# Altium schematic symbol library Transistor.SchLib: 3457 symbols (part 24 of 27)
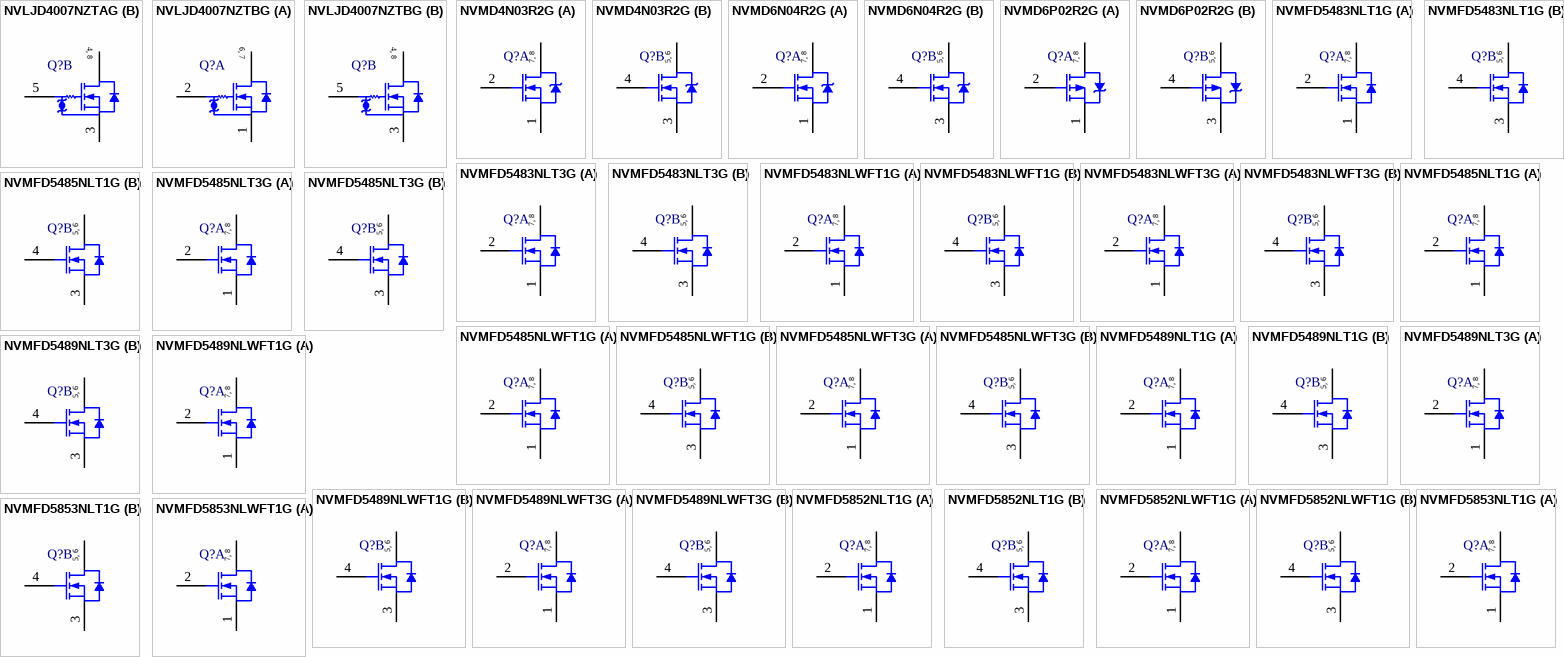
[diagram p117: symbols NVLJD4007NZTAG to NVMFD5853NLWFT1G]

## NVMFD5483NLT1G
designator Q?
Power MOSFET, 60 V, 36 mOhm , 24 A, Dual N-Channel, 8-Pin DFN, Pb-Free, Tape and Reel; Manufacturer: On Semiconductor; PartNumber: NVMFD5483NLT1G; Channel Polarity: N Channel; Ciss Typ (pF): 668; Coss Typ (pF): 152; Crss Typ (pF): 67; ID Max (A): 24; Qrr Typ (nC): 35; V(BR)DSS Min (V): 60; VGS Max (V): 20; VGS(th) Max (V): 2.5; DatasheetVersion: Rev. 1; PackageVersion: Rev. E, 02/2013; PackageReference: DFN-8-506BT; PackageDescription: 8-Pin Small Outline No-Lead, Body 4.9 x 5.9 mm, Pitch 1.27 mm; Supplier 1: Newark; Supplier Part Number 1: 11X3703; Supplier 2: Mouser; Supplier Part Number 2: 863-NVMFD5483NLT1G; Configuration: Dual; Package Type: DFN-8; Packing: Tape and Reel; RoHS: Pb-Free; Mounting Technology: Surface Mount; ComponentLink1Description: Manufacturer URL; ComponentLink1URL: http://www.onsemi.com/; ComponentLink2Description: Datasheet; ComponentLink2URL: http://www.onsemi.com/pub_link/Collateral/NVMFD5483NL-D.PDF; ComponentLink3Description: Package Specification; ComponentLink3URL: http://www.onsemi.com/pub_link/Collateral/506BT.PDF
footprint ONSC-DFN-8-506BT_V (DFN, 8-Leads, Body 5.9x4.9mm, Pitch 1.27mm)
part A pins: 1 S1, 2 G1, 7 D1, 8 D1
part B pins: 3 S2, 4 G2, 5 D2, 6 D2
part A text: 7, 8
part B text: 5, 6

## NVMFD5483NLT3G
designator Q?
Power MOSFET, 60 V, 24 A, 36 mOhm, Dual N-Channel, 8-Pin DFN, Pb-Free, Tape and Reel; Manufacturer: On Semiconductor; PartNumber: NVMFD5483NLT3G; Channel Polarity: N Channel; Ciss Typ (pF): 668; Coss Typ (pF): 152; Crss Typ (pF): 67; ID Max (A): 24; Qrr Typ (nC): 35; V(BR)DSS Min (V): 60; VGS Max (V): 20; VGS(th) Max (V): 2.5; DatasheetVersion: Rev. 1; PackageVersion: Rev. E, 02/2013; PackageReference: DFN-8-506BT; PackageDescription: 8-Pin Small Outline No-Lead, Body 4.9 x 5.9 mm, Pitch 1.27 mm; Supplier 1: Newark; Supplier Part Number 1: 11X3704; Supplier 2: Mouser; Supplier Part Number 2: 863-NVMFD5483NLT3G; Configuration: Dual; Package Type: DFN-8; Packing: Tape and Reel; RoHS: Pb-Free; Mounting Technology: Surface Mount; ComponentLink1Description: Manufacturer URL; ComponentLink1URL: http://www.onsemi.com/; ComponentLink2Description: Datasheet; ComponentLink2URL: http://www.onsemi.com/pub_link/Collateral/NVMFD5483NL-D.PDF; ComponentLink3Description: Package Specification; ComponentLink3URL: http://www.onsemi.com/pub_link/Collateral/506BT.PDF
footprint ONSC-DFN-8-506BT_V (DFN, 8-Leads, Body 5.9x4.9mm, Pitch 1.27mm)
part A pins: 1 S1, 2 G1, 7 D1, 8 D1
part B pins: 3 S2, 4 G2, 5 D2, 6 D2
part A text: 7, 8
part B text: 5, 6

## NVMFD5483NLWFT1G
designator Q?
Power MOSFET, 60 V, 36 mOhm , 24 A, Dual N-Channel, 8-Pin DFN, Pb-Free, Tape and Reel; Manufacturer: On Semiconductor; PartNumber: NVMFD5483NLWFT1G; Channel Polarity: N Channel; Ciss Typ (pF): 668; Coss Typ (pF): 152; Crss Typ (pF): 67; ID Max (A): 24; Qrr Typ (nC): 35; V(BR)DSS Min (V): 60; VGS Max (V): 20; VGS(th) Max (V): 2.5; DatasheetVersion: Rev. 1; PackageVersion: Rev. E, 02/2013; PackageReference: DFN-8-506BT; PackageDescription: 8-Pin Small Outline No-Lead, Body 4.9 x 5.9 mm, Pitch 1.27 mm; Supplier 1: Newark; Supplier Part Number 1: 11X3705; Supplier 2: Mouser; Supplier Part Number 2: 863-NVMFD5483NLWFT1G; Configuration: Dual; Package Type: DFN-8; Packing: Tape and Reel; RoHS: Pb-Free; Mounting Technology: Surface Mount; ComponentLink1Description: Manufacturer URL; ComponentLink1URL: http://www.onsemi.com/; ComponentLink2Description: Datasheet; ComponentLink2URL: http://www.onsemi.com/pub_link/Collateral/NVMFD5483NL-D.PDF; ComponentLink3Description: Package Specification; ComponentLink3URL: http://www.onsemi.com/pub_link/Collateral/506BT.PDF
footprint ONSC-DFN-8-506BT_V (DFN, 8-Leads, Body 5.9x4.9mm, Pitch 1.27mm)
part A pins: 1 S1, 2 G1, 7 D1, 8 D1
part B pins: 3 S2, 4 G2, 5 D2, 6 D2
part A text: 7, 8
part B text: 5, 6

## NVMFD5483NLWFT3G
designator Q?
Power MOSFET, 60 V, 24 A, 36 mOhm, Dual N-Channel, 8-Pin DFN, Pb-Free, Tape and Reel; Manufacturer: On Semiconductor; PartNumber: NVMFD5483NLWFT3G; Channel Polarity: N Channel; Ciss Typ (pF): 668; Coss Typ (pF): 152; Crss Typ (pF): 67; ID Max (A): 24; Qrr Typ (nC): 35; V(BR)DSS Min (V): 60; VGS Max (V): 20; VGS(th) Max (V): 2.5; DatasheetVersion: Rev. 1; PackageVersion: Rev. E, 02/2013; PackageReference: DFN-8-506BT; PackageDescription: 8-Pin Small Outline No-Lead, Body 4.9 x 5.9 mm, Pitch 1.27 mm; Supplier 1: Newark; Supplier Part Number 1: 11X3706; Supplier 2: Mouser; Supplier Part Number 2: 863-NVMFD5483NLWFT3G; Configuration: Dual; Package Type: DFN-8; Packing: Tape and Reel; RoHS: Pb-Free; Mounting Technology: Surface Mount; ComponentLink1Description: Manufacturer URL; ComponentLink1URL: http://www.onsemi.com/; ComponentLink2Description: Datasheet; ComponentLink2URL: http://www.onsemi.com/pub_link/Collateral/NVMFD5483NL-D.PDF; ComponentLink3Description: Package Specification; ComponentLink3URL: http://www.onsemi.com/pub_link/Collateral/506BT.PDF
footprint ONSC-DFN-8-506BT_V (DFN, 8-Leads, Body 5.9x4.9mm, Pitch 1.27mm)
part A pins: 1 S1, 2 G1, 7 D1, 8 D1
part B pins: 3 S2, 4 G2, 5 D2, 6 D2
part A text: 7, 8
part B text: 5, 6

## NVMFD5485NLT1G
designator Q?
Power MOSFET, 60 V, 20 A, 44 mOhm, Dual N-Channel, 8-Pin DFN, Pb-Free, Tape and Reel; Manufacturer: On Semiconductor; PartNumber: NVMFD5485NLT1G; Channel Polarity: N Channel; Ciss Typ (pF): 560; Coss Typ (pF): 126; Crss Typ (pF): 58; ID Max (A): 20; Qrr Typ (nC): 35.5; V(BR)DSS Min (V): 60; VGS(th) Max (V): 2.5; DatasheetVersion: Rev. 1; PackageVersion: Rev. E, 02/2013; PackageReference: DFN-8-506BT; PackageDescription: 8-Pin Small Outline No-Lead, Body 4.9 x 5.9 mm, Pitch 1.27 mm; Supplier 1: Newark; Supplier Part Number 1: 11X3707; Supplier 2: Mouser; Supplier Part Number 2: 863-NVMFD5485NLT1G; Configuration: Dual; Package Type: DFN-8; Packing: Tape and Reel; RoHS: Pb-Free; VGS Max (V): 20; Mounting Technology: Surface Mount; ComponentLink1Description: Manufacturer URL; ComponentLink1URL: http://www.onsemi.com/; ComponentLink2Description: Datasheet; ComponentLink2URL: http://www.onsemi.com/pub_link/Collateral/NVMFD5485NL-D.PDF; ComponentLink3Description: Package Specification; ComponentLink3URL: http://www.onsemi.com/pub_link/Collateral/506BT.PDF
footprint ONSC-DFN-8-506BT_V (DFN, 8-Leads, Body 5.9x4.9mm, Pitch 1.27mm)
part A pins: 1 S1, 2 G1, 7 D1, 8 D1
part B pins: 3 S2, 4 G2, 5 D2, 6 D2
part A text: 7, 8
part B text: 5, 6

## NVMFD5485NLT3G
designator Q?
Power MOSFET, 60 V, 20 A, 44 mOhm, Dual N-Channel, 8-Pin DFN, Pb-Free, Tape and Reel; Manufacturer: On Semiconductor; PartNumber: NVMFD5485NLT3G; Channel Polarity: N Channel; Ciss Typ (pF): 560; Coss Typ (pF): 126; Crss Typ (pF): 58; ID Max (A): 20; Qrr Typ (nC): 35.5; V(BR)DSS Min (V): 60; VGS(th) Max (V): 2.5; DatasheetVersion: Rev. 1; PackageVersion: Rev. E, 02/2013; PackageReference: DFN-8-506BT; PackageDescription: 8-Pin Small Outline No-Lead, Body 4.9 x 5.9 mm, Pitch 1.27 mm; Supplier 1: Newark; Supplier Part Number 1: 11X3708; Supplier 2: Mouser; Supplier Part Number 2: 863-NVMFD5485NLT3G; Configuration: Dual; Package Type: DFN-8; Packing: Tape and Reel; RoHS: Pb-Free; VGS Max (V): 20; Mounting Technology: Surface Mount; ComponentLink1Description: Manufacturer URL; ComponentLink1URL: http://www.onsemi.com/; ComponentLink2Description: Datasheet; ComponentLink2URL: http://www.onsemi.com/pub_link/Collateral/NVMFD5485NL-D.PDF; ComponentLink3Description: Package Specification; ComponentLink3URL: http://www.onsemi.com/pub_link/Collateral/506BT.PDF
footprint ONSC-DFN-8-506BT_V (DFN, 8-Leads, Body 5.9x4.9mm, Pitch 1.27mm)
part A pins: 1 S1, 2 G1, 7 D1, 8 D1
part B pins: 3 S2, 4 G2, 5 D2, 6 D2
part A text: 7, 8
part B text: 5, 6

## NVMFD5485NLWFT1G
designator Q?
Power MOSFET, 60 V, 20 A, 44 mOhm, Dual N-Channel, 8-Pin DFN, Pb-Free, Tape and Reel; Manufacturer: On Semiconductor; PartNumber: NVMFD5485NLWFT1G; Channel Polarity: N Channel; Ciss Typ (pF): 560; Coss Typ (pF): 126; Crss Typ (pF): 58; ID Max (A): 20; Qrr Typ (nC): 35.5; V(BR)DSS Min (V): 60; VGS(th) Max (V): 2.5; DatasheetVersion: Rev. 1; PackageVersion: Rev. E, 02/2013; PackageReference: DFN-8-506BT; PackageDescription: 8-Pin Small Outline No-Lead, Body 4.9 x 5.9 mm, Pitch 1.27 mm; Supplier 1: Newark; Supplier Part Number 1: 11X3709; Supplier 2: Mouser; Supplier Part Number 2: 863-NVMFD5485NLWFT1G; Configuration: Dual; Package Type: DFN-8; Packing: Tape and Reel; RoHS: Pb-Free; VGS Max (V): 20; Mounting Technology: Surface Mount; ComponentLink1Description: Manufacturer URL; ComponentLink1URL: http://www.onsemi.com/; ComponentLink2Description: Datasheet; ComponentLink2URL: http://www.onsemi.com/pub_link/Collateral/NVMFD5485NL-D.PDF; ComponentLink3Description: Package Specification; ComponentLink3URL: http://www.onsemi.com/pub_link/Collateral/506BT.PDF
footprint ONSC-DFN-8-506BT_V (DFN, 8-Leads, Body 5.9x4.9mm, Pitch 1.27mm)
part A pins: 1 S1, 2 G1, 7 D1, 8 D1
part B pins: 3 S2, 4 G2, 5 D2, 6 D2
part A text: 7, 8
part B text: 5, 6

## NVMFD5485NLWFT3G
designator Q?
Power MOSFET, 60 V, 20 A, 44 mOhm, Dual N-Channel, 8-Pin DFN, Pb-Free, Tape and Reel; Manufacturer: On Semiconductor; PartNumber: NVMFD5485NLWFT3G; Channel Polarity: N Channel; Ciss Typ (pF): 560; Coss Typ (pF): 126; Crss Typ (pF): 58; ID Max (A): 20; Qrr Typ (nC): 35.5; V(BR)DSS Min (V): 60; VGS(th) Max (V): 2.5; DatasheetVersion: Rev. 1; PackageVersion: Rev. E, 02/2013; PackageReference: DFN-8-506BT; PackageDescription: 8-Pin Small Outline No-Lead, Body 4.9 x 5.9 mm, Pitch 1.27 mm; Supplier 1: Newark; Supplier Part Number 1: 11X3710; Supplier 2: Mouser; Supplier Part Number 2: 863-NVMFD5485NLWFT3G; Configuration: Dual; Package Type: DFN-8; Packing: Tape and Reel; RoHS: Pb-Free; VGS Max (V): 20; Mounting Technology: Surface Mount; ComponentLink1Description: Manufacturer URL; ComponentLink1URL: http://www.onsemi.com/; ComponentLink2Description: Datasheet; ComponentLink2URL: http://www.onsemi.com/pub_link/Collateral/NVMFD5485NL-D.PDF; ComponentLink3Description: Package Specification; ComponentLink3URL: http://www.onsemi.com/pub_link/Collateral/506BT.PDF
footprint ONSC-DFN-8-506BT_V (DFN, 8-Leads, Body 5.9x4.9mm, Pitch 1.27mm)
part A pins: 1 S1, 2 G1, 7 D1, 8 D1
part B pins: 3 S2, 4 G2, 5 D2, 6 D2
part A text: 7, 8
part B text: 5, 6

## NVMFD5489NLT1G
designator Q?
Power MOSFET, 60 V, 12 A, 65 mOhm, Dual N-Channel Logic Level, 8-Pin DFN, Pb-Free, Tape and Reel; Manufacturer: On Semiconductor; PartNumber: NVMFD5489NLT1G; Channel Polarity: N Channel; Ciss Typ (pF): 330; Coss Typ (pF): 80; Crss Typ (pF): 39; ID Max (A): 12; Qrr Typ (nC): 26.5; V(BR)DSS Min (V): 60; VGS Max (V): 20; VGS(th) Max (V): 2.5; DatasheetVersion: Rev. 1; PackageVersion: Rev. E, 02/2013; PackageReference: DFN-8-506BT; PackageDescription: 8-Pin Small Outline No-Lead, Body 4.9 x 5.9 mm, Pitch 1.27 mm; Supplier 1: Newark; Supplier Part Number 1: 11X3711; Supplier 2: Mouser; Supplier Part Number 2: 863-NVMFD5489NLT1G; Configuration: Dual; Package Type: DFN-8; Packing: Tape and Reel; RoHS: Pb-Free; Mounting Technology: Surface Mount; ComponentLink1Description: Manufacturer URL; ComponentLink1URL: http://www.onsemi.com/; ComponentLink2Description: Datasheet; ComponentLink2URL: http://www.onsemi.com/pub_link/Collateral/NVMFD5489NL-D.PDF; ComponentLink3Description: Package Specification; ComponentLink3URL: http://www.onsemi.com/pub_link/Collateral/506BT.PDF
footprint ONSC-DFN-8-506BT_V (DFN, 8-Leads, Body 5.9x4.9mm, Pitch 1.27mm)
part A pins: 1 S1, 2 G1, 7 D1, 8 D1
part B pins: 3 S2, 4 G2, 5 D2, 6 D2
part A text: 7, 8
part B text: 5, 6

## NVMFD5489NLT3G
designator Q?
Power MOSFET, 60 V, 12 A, 65 mOhm, Dual N-Channel Logic Level, 8-Pin DFN, Pb-Free, Tape and Reel; Manufacturer: On Semiconductor; PartNumber: NVMFD5489NLT3G; Channel Polarity: N Channel; Ciss Typ (pF): 330; Coss Typ (pF): 80; Crss Typ (pF): 39; ID Max (A): 12; Qrr Typ (nC): 26.5; V(BR)DSS Min (V): 60; VGS Max (V): 20; VGS(th) Max (V): 2.5; DatasheetVersion: Rev. 1; PackageVersion: Rev. E, 02/2013; PackageReference: DFN-8-506BT; PackageDescription: 8-Pin Small Outline No-Lead, Body 4.9 x 5.9 mm, Pitch 1.27 mm; Supplier 1: Newark; Supplier Part Number 1: 11X3712; Supplier 2: Mouser; Supplier Part Number 2: 863-NVMFD5489NLT3G; Configuration: Dual; Package Type: DFN-8; Packing: Tape and Reel; RoHS: Pb-Free; Mounting Technology: Surface Mount; ComponentLink1Description: Manufacturer URL; ComponentLink1URL: http://www.onsemi.com/; ComponentLink2Description: Datasheet; ComponentLink2URL: http://www.onsemi.com/pub_link/Collateral/NVMFD5489NL-D.PDF; ComponentLink3Description: Package Specification; ComponentLink3URL: http://www.onsemi.com/pub_link/Collateral/506BT.PDF
footprint ONSC-DFN-8-506BT_V (DFN, 8-Leads, Body 5.9x4.9mm, Pitch 1.27mm)
part A pins: 1 S1, 2 G1, 7 D1, 8 D1
part B pins: 3 S2, 4 G2, 5 D2, 6 D2
part A text: 7, 8
part B text: 5, 6

## NVMFD5489NLWFT1G
designator Q?
Power MOSFET, 60 V, 12 A, 65 mOhm, Dual N-Channel Logic Level, 8-Pin DFN, Pb-Free, Tape and Reel; Manufacturer: On Semiconductor; PartNumber: NVMFD5489NLWFT1G; Channel Polarity: N Channel; Ciss Typ (pF): 330; Coss Typ (pF): 80; Crss Typ (pF): 39; ID Max (A): 12; Qrr Typ (nC): 26.5; V(BR)DSS Min (V): 60; VGS Max (V): 20; VGS(th) Max (V): 2.5; DatasheetVersion: Rev. 1; PackageVersion: Rev. E, 02/2013; PackageReference: DFN-8-506BT; PackageDescription: 8-Pin Small Outline No-Lead, Body 4.9 x 5.9 mm, Pitch 1.27 mm; Supplier 1: Newark; Supplier Part Number 1: 11X3713; Supplier 2: Mouser; Supplier Part Number 2: 863-NVMFD5489NLWFT1G; Configuration: Dual; Package Type: DFN-8; Packing: Tape and Reel; RoHS: Pb-Free; Mounting Technology: Surface Mount; ComponentLink1Description: Manufacturer URL; ComponentLink1URL: http://www.onsemi.com/; ComponentLink2Description: Datasheet; ComponentLink2URL: http://www.onsemi.com/pub_link/Collateral/NVMFD5489NL-D.PDF; ComponentLink3Description: Package Specification; ComponentLink3URL: http://www.onsemi.com/pub_link/Collateral/506BT.PDF
footprint ONSC-DFN-8-506BT_V (DFN, 8-Leads, Body 5.9x4.9mm, Pitch 1.27mm)
part A pins: 1 S1, 2 G1, 7 D1, 8 D1
part B pins: 3 S2, 4 G2, 5 D2, 6 D2
part A text: 7, 8
part B text: 5, 6

## NVMFD5489NLWFT3G
designator Q?
Power MOSFET, 60 V, 12 A, 65 mOhm, Dual N-Channel Logic Level, 8-Pin DFN, Pb-Free, Tape and Reel; Manufacturer: On Semiconductor; PartNumber: NVMFD5489NLWFT3G; Channel Polarity: N Channel; Ciss Typ (pF): 330; Coss Typ (pF): 80; Crss Typ (pF): 39; ID Max (A): 12; Qrr Typ (nC): 26.5; V(BR)DSS Min (V): 60; VGS Max (V): 20; VGS(th) Max (V): 2.5; DatasheetVersion: Rev. 1; PackageVersion: Rev. E, 02/2013; PackageReference: DFN-8-506BT; PackageDescription: 8-Pin Small Outline No-Lead, Body 4.9 x 5.9 mm, Pitch 1.27 mm; Supplier 1: Newark; Supplier Part Number 1: 11X3714; Supplier 2: Mouser; Supplier Part Number 2: 863-NVMFD5489NLWFT3G; Configuration: Dual; Package Type: DFN-8; Packing: Tape and Reel; RoHS: Pb-Free; Mounting Technology: Surface Mount; ComponentLink1Description: Manufacturer URL; ComponentLink1URL: http://www.onsemi.com/; ComponentLink2Description: Datasheet; ComponentLink2URL: http://www.onsemi.com/pub_link/Collateral/NVMFD5489NL-D.PDF; ComponentLink3Description: Package Specification; ComponentLink3URL: http://www.onsemi.com/pub_link/Collateral/506BT.PDF
footprint ONSC-DFN-8-506BT_V (DFN, 8-Leads, Body 5.9x4.9mm, Pitch 1.27mm)
part A pins: 1 S1, 2 G1, 7 D1, 8 D1
part B pins: 3 S2, 4 G2, 5 D2, 6 D2
part A text: 7, 8
part B text: 5, 6

## NVMFD5852NLT1G
designator Q?
Power MOSFET, 40 V, 44 A, 6.9 mOhm, Dual N-Channel Logic Level, 8-Pin DFN, Pb-Free, Tape and Reel; Manufacturer: On Semiconductor; PartNumber: NVMFD5852NLT1G; Channel Polarity: N Channel; Ciss Typ (pF): 1800; Coss Typ (pF): 240; Crss Typ (pF): 180; ID Max (A): 44; Qrr Typ (nC): 15.2; V(BR)DSS Min (V): 40; VGS Max (V): 20; VGS(th) Max (V): 2.4; DatasheetVersion: Rev. 5; PackageVersion: Rev. E, 02/2013; PackageReference: DFN-8-506BT; PackageDescription: 8-Pin Small Outline No-Lead, Body 4.9 x 5.9 mm, Pitch 1.27 mm; Supplier 1: Newark; Supplier Part Number 1: 60W1850; Supplier 2: Mouser; Supplier Part Number 2: 863-NVMFD5852NLT1G; Configuration: Dual; Package Type: DFN-8; Packing: Tape and Reel; RoHS: Pb-Free; Mounting Technology: Surface Mount; ComponentLink1Description: Manufacturer URL; ComponentLink1URL: http://www.onsemi.com/; ComponentLink2Description: Datasheet; ComponentLink2URL: http://www.onsemi.com/pub_link/Collateral/NVMFD5852NL-D.PDF; ComponentLink3Description: Package Specification; ComponentLink3URL: http://www.onsemi.com/pub_link/Collateral/506BT.PDF
footprint ONSC-DFN-8-506BT_V (DFN, 8-Leads, Body 5.9x4.9mm, Pitch 1.27mm)
part A pins: 1 S1, 2 G1, 7 D1, 8 D1
part B pins: 3 S2, 4 G2, 5 D2, 6 D2
part A text: 7, 8
part B text: 5, 6

## NVMFD5852NLWFT1G
designator Q?
Power MOSFET, 40 V, 44 A, 6.9 mOhm, Dual N-Channel Logic Level, 8-Pin DFN, Pb-Free, Tape and Reel; Manufacturer: On Semiconductor; PartNumber: NVMFD5852NLWFT1G; Channel Polarity: N Channel; Ciss Typ (pF): 1800; Coss Typ (pF): 240; Crss Typ (pF): 180; ID Max (A): 44; Qrr Typ (nC): 15.2; V(BR)DSS Min (V): 40; VGS Max (V): 20; VGS(th) Max (V): 2.4; DatasheetVersion: Rev. 5; PackageVersion: Rev. E, 02/2013; PackageReference: DFN-8-506BT; PackageDescription: 8-Pin Small Outline No-Lead, Body 4.9 x 5.9 mm, Pitch 1.27 mm; Supplier 1: Newark; Supplier Part Number 1: 11X3715; Supplier 2: Mouser; Supplier Part Number 2: 863-NVMFD5852NLWFT1G; Configuration: Dual; Package Type: DFN-8; Packing: Tape and Reel; RoHS: Pb-Free; Mounting Technology: Surface Mount; ComponentLink1Description: Manufacturer URL; ComponentLink1URL: http://www.onsemi.com/; ComponentLink2Description: Datasheet; ComponentLink2URL: http://www.onsemi.com/pub_link/Collateral/NVMFD5852NL-D.PDF; ComponentLink3Description: Package Specification; ComponentLink3URL: http://www.onsemi.com/pub_link/Collateral/506BT.PDF
footprint ONSC-DFN-8-506BT_V (DFN, 8-Leads, Body 5.9x4.9mm, Pitch 1.27mm)
part A pins: 1 S1, 2 G1, 7 D1, 8 D1
part B pins: 3 S2, 4 G2, 5 D2, 6 D2
part A text: 7, 8
part B text: 5, 6

## NVMFD5853NLT1G
designator Q?
Power MOSFET, 40 V, 34 A, 10 mOhm, Dual N-Channel Logic Level, 8-Pin DFN, Pb-Free, Tape and Reel; Manufacturer: On Semiconductor; PartNumber: NVMFD5853NLT1G; Channel Polarity: N Channel; Ciss Typ (pF): 1100; Coss Typ (pF): 152; Crss Typ (pF): 100; ID Max (A): 34; Qrr Typ (nC): 12.1; V(BR)DSS Min (V): 40; VGS Max (V): 20; VGS(th) Max (V): 2.4; DatasheetVersion: Rev. 3; PackageVersion: Rev. E, 02/2013; PackageReference: DFN-8-506BT; PackageDescription: 8-Pin Small Outline No-Lead, Body 4.9 x 5.9 mm, Pitch 1.27 mm; Supplier 1: Newark; Supplier Part Number 1: 72W2342; Supplier 2: Mouser; Supplier Part Number 2: 863-NVMFD5853NLT1G; Configuration: Dual; Package Type: SO-8FL Dual / DFN-8; Packing: Tape and Reel; RoHS: Pb-Free; Mounting Technology: Surface Mount; ComponentLink1Description: Manufacturer URL; ComponentLink1URL: http://www.onsemi.com/; ComponentLink2Description: Datasheet; ComponentLink2URL: http://www.onsemi.com/pub_link/Collateral/NVMFD5853NL-D.PDF; ComponentLink3Description: Package Specification; ComponentLink3URL: http://www.onsemi.com/pub_link/Collateral/506BT.PDF
footprint ONSC-DFN-8-506BT_V (DFN, 8-Leads, Body 5.9x4.9mm, Pitch 1.27mm)
part A pins: 1 S1, 2 G1, 7 D1, 8 D1
part B pins: 3 S2, 4 G2, 5 D2, 6 D2
part A text: 7, 8
part B text: 5, 6

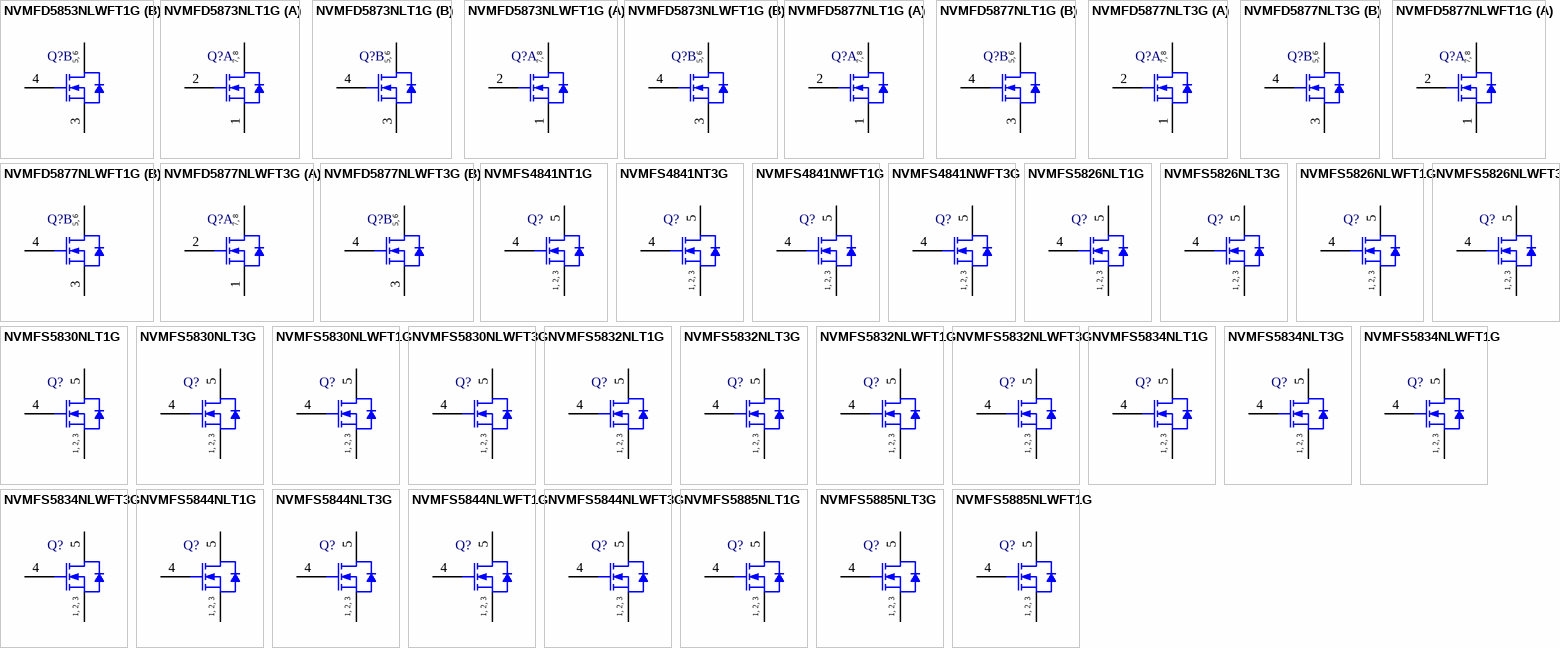
[diagram p83: symbols NVMFD5853NLWFT1G to NVMFS5885NLWFT1G]

## NVMFD5853NLWFT1G
designator Q?
Power MOSFET, 40 V, 34 A, 10 mOhm, Dual N-Channel Logic Level, 8-Pin DFN, Pb-Free, Tape and Reel; Manufacturer: On Semiconductor; PartNumber: NVMFD5853NLWFT1G; Channel Polarity: N Channel; Ciss Typ (pF): 1100; Coss Typ (pF): 152; Crss Typ (pF): 100; ID Max (A): 34; Qrr Typ (nC): 12.1; V(BR)DSS Min (V): 40; VGS Max (V): 20; VGS(th) Max (V): 2.4; DatasheetVersion: Rev. 3; PackageVersion: Rev. E, 02/2013; PackageReference: DFN-8-506BT; PackageDescription: 8-Pin Small Outline No-Lead, Body 4.9 x 5.9 mm, Pitch 1.27 mm; Supplier 1: Newark; Supplier Part Number 1: 11X3716; Supplier 2: Mouser; Supplier Part Number 2: 863-NVMFD5853NLWFT1G; Configuration: Dual; Package Type: SO-8FL Dual / DFN-8; Packing: Tape and Reel; RoHS: Pb-Free; Mounting Technology: Surface Mount; ComponentLink1Description: Manufacturer URL; ComponentLink1URL: http://www.onsemi.com/; ComponentLink2Description: Datasheet; ComponentLink2URL: http://www.onsemi.com/pub_link/Collateral/NVMFD5853NL-D.PDF; ComponentLink3Description: Package Specification; ComponentLink3URL: http://www.onsemi.com/pub_link/Collateral/506BT.PDF
footprint ONSC-DFN-8-506BT_V (DFN, 8-Leads, Body 5.9x4.9mm, Pitch 1.27mm)
part A pins: 1 S1, 2 G1, 7 D1, 8 D1
part B pins: 3 S2, 4 G2, 5 D2, 6 D2
part A text: 7, 8
part B text: 5, 6

## NVMFD5873NLT1G
designator Q?
Power MOSFET, 60 V, 58 A, 13 mOhm, Dual N-Channel Logic Level, 8-Pin DFN, Pb-Free, Tape and Reel; Manufacturer: On Semiconductor; PartNumber: NVMFD5873NLT1G; Channel Polarity: N Channel; Ciss Typ (pF): 1560; Coss Typ (pF): 145; Crss Typ (pF): 98; ID Max (A): 58; Qrr Typ (nC): 18; V(BR)DSS Min (V): 60; VGS Max (V): 20; VGS(th) Max (V): 2.5; DatasheetVersion: Rev. 2; PackageVersion: Rev. E, 02/2013; PackageReference: DFN-8-506BT; PackageDescription: 8-Pin Small Outline No-Lead, Body 4.9 x 5.9 mm, Pitch 1.27 mm; Supplier 1: Newark; Supplier Part Number 1: 72W2343; Supplier 2: Mouser; Supplier Part Number 2: 863-NVMFD5873NLT1G; Configuration: Dual; Package Type: SO-8FL Dual / DFN-8; Packing: Tape and Reel; RoHS: Pb-Free; Mounting Technology: Surface Mount; ComponentLink1Description: Manufacturer URL; ComponentLink1URL: http://www.onsemi.com/; ComponentLink2Description: Datasheet; ComponentLink2URL: http://www.onsemi.com/pub_link/Collateral/NVMFD5873NL-D.PDF; ComponentLink3Description: Package Specification; ComponentLink3URL: http://www.onsemi.com/pub_link/Collateral/506BT.PDF
footprint ONSC-DFN-8-506BT_V (DFN, 8-Leads, Body 5.9x4.9mm, Pitch 1.27mm)
part A pins: 1 S1, 2 G1, 7 D1, 8 D1
part B pins: 3 S2, 4 G2, 5 D2, 6 D2
part A text: 7, 8
part B text: 5, 6

## NVMFD5873NLWFT1G
designator Q?
Power MOSFET, 60 V, 58 A, 13 mOhm, Dual N-Channel Logic Level, 8-Pin DFN, Pb-Free, Tape and Reel; Manufacturer: On Semiconductor; PartNumber: NVMFD5873NLWFT1G; Channel Polarity: N Channel; Ciss Typ (pF): 1560; Coss Typ (pF): 145; Crss Typ (pF): 98; ID Max (A): 58; Qrr Typ (nC): 18; V(BR)DSS Min (V): 60; VGS Max (V): 20; VGS(th) Max (V): 2.5; DatasheetVersion: Rev. 2; PackageVersion: Rev. E, 02/2013; PackageReference: DFN-8-506BT; PackageDescription: 8-Pin Small Outline No-Lead, Body 4.9 x 5.9 mm, Pitch 1.27 mm; Supplier 1: Newark; Supplier Part Number 1: 11X3717; Supplier 2: Mouser; Supplier Part Number 2: 863-NVMFD5873NLWFT1G; Configuration: Dual; Package Type: SO-8FL Dual / DFN-8; Packing: Tape and Reel; RoHS: Pb-Free; Mounting Technology: Surface Mount; ComponentLink1Description: Manufacturer URL; ComponentLink1URL: http://www.onsemi.com/; ComponentLink2Description: Datasheet; ComponentLink2URL: http://www.onsemi.com/pub_link/Collateral/NVMFD5873NL-D.PDF; ComponentLink3Description: Package Specification; ComponentLink3URL: http://www.onsemi.com/pub_link/Collateral/506BT.PDF
footprint ONSC-DFN-8-506BT_V (DFN, 8-Leads, Body 5.9x4.9mm, Pitch 1.27mm)
part A pins: 1 S1, 2 G1, 7 D1, 8 D1
part B pins: 3 S2, 4 G2, 5 D2, 6 D2
part A text: 7, 8
part B text: 5, 6

## NVMFD5877NLT1G
designator Q?
Power MOSFET, 60 V, 17 A, 39 mOhm, Dual N-Channel, Logic Level, 8-Pin DFN, Pb-Free, Tape and Reel; Manufacturer: On Semiconductor; PartNumber: NVMFD5877NLT1G; Channel Polarity: N Channel; Ciss Typ (pF): 540; Coss Typ (pF): 55; Crss Typ (pF): 36; ID Max (A): 17; Qrr Typ (nC): 11; V(BR)DSS Min (V): 60; VGS Max (V): 20; VGS(th) Max (V): 3; DatasheetVersion: Rev. 7; PackageVersion: Rev. E, 02/2013; PackageReference: DFN-8-506BT; PackageDescription: 8-Pin Small Outline No-Lead, Body 4.9 x 5.9 mm, Pitch 1.27 mm; Supplier 1: Digi-Key; Supplier Part Number 1: NVMFD5877NLT1G-ND; Supplier 2: Newark; Supplier Part Number 2: 52T8348; Supplier 3: Mouser; Supplier Part Number 3: 863-NVMFD5877NLT1G; Configuration: Dual; Package Type: SO-8FL Dual / DFN-8; Packing: Tape and Reel; RoHS: Pb-Free; Mounting Technology: Surface Mount; ComponentLink1Description: Manufacturer URL; ComponentLink1URL: http://www.onsemi.com/; ComponentLink2Description: Datasheet; ComponentLink2URL: http://www.onsemi.com/pub_link/Collateral/NVMFD5877NL-D.PDF; ComponentLink3Description: Package Specification; ComponentLink3URL: http://www.onsemi.com/pub_link/Collateral/506BT.PDF
footprint ONSC-DFN-8-506BT_V (DFN, 8-Leads, Body 5.9x4.9mm, Pitch 1.27mm)
part A pins: 1 S1, 2 G1, 7 D1, 8 D1
part B pins: 3 S2, 4 G2, 5 D2, 6 D2
part A text: 7, 8
part B text: 5, 6

## NVMFD5877NLT3G
designator Q?
Power MOSFET, 60 V, 17 A, 39 mOhm, Dual N-Channel, Logic Level, 8-Pin DFN, Pb-Free, Tape and Reel; Manufacturer: On Semiconductor; PartNumber: NVMFD5877NLT3G; Channel Polarity: N Channel; Ciss Typ (pF): 540; Coss Typ (pF): 55; Crss Typ (pF): 36; ID Max (A): 17; Qrr Typ (nC): 11; V(BR)DSS Min (V): 60; VGS Max (V): 20; VGS(th) Max (V): 3; DatasheetVersion: Rev. 7; PackageVersion: Rev. E, 02/2013; PackageReference: DFN-8-506BT; PackageDescription: 8-Pin Small Outline No-Lead, Body 4.9 x 5.9 mm, Pitch 1.27 mm; Supplier 1: Digi-Key; Supplier Part Number 1: NVMFD5877NLT3G-ND; Supplier 2: Mouser; Supplier Part Number 2: 863-NVMFD5877NLT3G; Configuration: Dual; Package Type: SO-8FL Dual / DFN-8; Packing: Tape and Reel; RoHS: Pb-Free; Mounting Technology: Surface Mount; ComponentLink1Description: Manufacturer URL; ComponentLink1URL: http://www.onsemi.com/; ComponentLink2Description: Datasheet; ComponentLink2URL: http://www.onsemi.com/pub_link/Collateral/NVMFD5877NL-D.PDF; ComponentLink3Description: Package Specification; ComponentLink3URL: http://www.onsemi.com/pub_link/Collateral/506BT.PDF
footprint ONSC-DFN-8-506BT_V (DFN, 8-Leads, Body 5.9x4.9mm, Pitch 1.27mm)
part A pins: 1 S1, 2 G1, 7 D1, 8 D1
part B pins: 3 S2, 4 G2, 5 D2, 6 D2
part A text: 7, 8
part B text: 5, 6

## NVMFD5877NLWFT1G
designator Q?
Power MOSFET, 60 V, 17 A, 39 mOhm, Dual N-Channel, Logic Level, 8-Pin DFN, Pb-Free, Tape and Reel; Manufacturer: On Semiconductor; PartNumber: NVMFD5877NLWFT1G; Channel Polarity: N Channel; Ciss Typ (pF): 540; Coss Typ (pF): 55; Crss Typ (pF): 36; ID Max (A): 17; Qrr Typ (nC): 11; V(BR)DSS Min (V): 60; VGS Max (V): 20; VGS(th) Max (V): 3; DatasheetVersion: Rev. 7; PackageVersion: Rev. E, 02/2013; PackageReference: DFN-8-506BT; PackageDescription: 8-Pin Small Outline No-Lead, Body 4.9 x 5.9 mm, Pitch 1.27 mm; Supplier 1: Newark; Supplier Part Number 1: 11X3718; Supplier 2: Mouser; Supplier Part Number 2: 863-NVMFD5877NLWFT1G; Configuration: Dual; Package Type: SO-8FL Dual / DFN-8; Packing: Tape and Reel; RoHS: Pb-Free; Mounting Technology: Surface Mount; ComponentLink1Description: Manufacturer URL; ComponentLink1URL: http://www.onsemi.com/; ComponentLink2Description: Datasheet; ComponentLink2URL: http://www.onsemi.com/pub_link/Collateral/NVMFD5877NL-D.PDF; ComponentLink3Description: Package Specification; ComponentLink3URL: http://www.onsemi.com/pub_link/Collateral/506BT.PDF
footprint ONSC-DFN-8-506BT_V (DFN, 8-Leads, Body 5.9x4.9mm, Pitch 1.27mm)
part A pins: 1 S1, 2 G1, 7 D1, 8 D1
part B pins: 3 S2, 4 G2, 5 D2, 6 D2
part A text: 7, 8
part B text: 5, 6

## NVMFD5877NLWFT3G
designator Q?
Power MOSFET, 60 V, 17 A, 39 mOhm, Dual N-Channel, Logic Level, 8-Pin DFN, Pb-Free, Tape and Reel; Manufacturer: On Semiconductor; PartNumber: NVMFD5877NLWFT3G; Channel Polarity: N Channel; Ciss Typ (pF): 540; Coss Typ (pF): 55; Crss Typ (pF): 36; ID Max (A): 17; Qrr Typ (nC): 11; V(BR)DSS Min (V): 60; VGS Max (V): 20; VGS(th) Max (V): 3; DatasheetVersion: Rev. 7; PackageVersion: Rev. E, 02/2013; PackageReference: DFN-8-506BT; PackageDescription: 8-Pin Small Outline No-Lead, Body 4.9 x 5.9 mm, Pitch 1.27 mm; Supplier 1: Newark; Supplier Part Number 1: 11X3719; Supplier 2: Mouser; Supplier Part Number 2: 863-NVMFD5877NLWFT3G; Configuration: Dual; Package Type: SO-8FL Dual / DFN-8; Packing: Tape and Reel; RoHS: Pb-Free; Mounting Technology: Surface Mount; ComponentLink1Description: Manufacturer URL; ComponentLink1URL: http://www.onsemi.com/; ComponentLink2Description: Datasheet; ComponentLink2URL: http://www.onsemi.com/pub_link/Collateral/NVMFD5877NL-D.PDF; ComponentLink3Description: Package Specification; ComponentLink3URL: http://www.onsemi.com/pub_link/Collateral/506BT.PDF
footprint ONSC-DFN-8-506BT_V (DFN, 8-Leads, Body 5.9x4.9mm, Pitch 1.27mm)
part A pins: 1 S1, 2 G1, 7 D1, 8 D1
part B pins: 3 S2, 4 G2, 5 D2, 6 D2
part A text: 7, 8
part B text: 5, 6
